# Altium footprint library Connector B2B.PcbLib: 8 footprints
Each footprint in its own frame and in the unit in brackets; x right, y up, seen from the top. Pads: shape width x height; smd on the part's side, far side on the other; paste and mask are expansions set on the pad; w line width, h text height; cw(c..) or ccw(c..) is an arc to the next point about the centre after c.
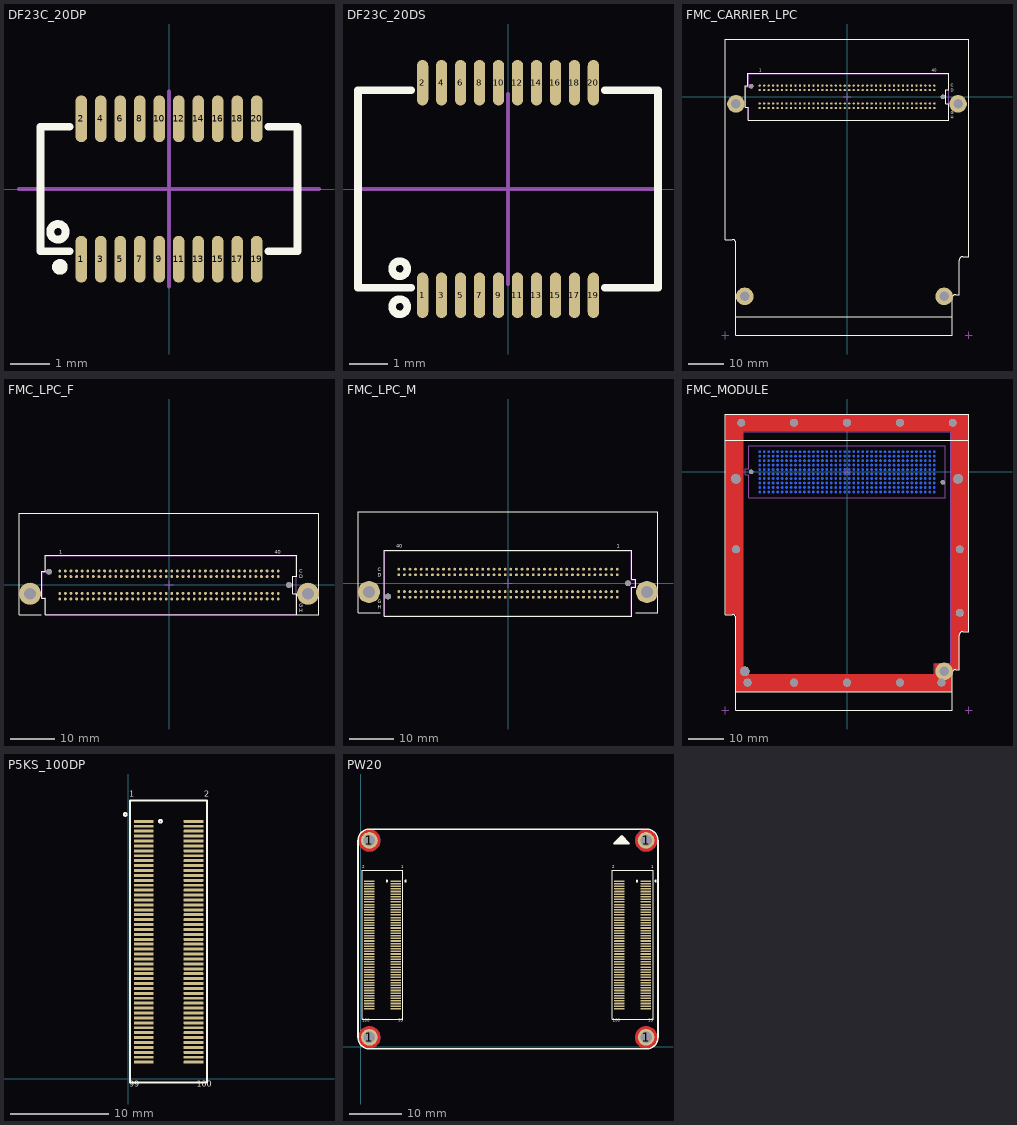
[diagram p0: the footprints below, top view; thin cyan lines are the x and y axes]

## DF23C_20DP [mm] "Hirose Connector DF23C-20DP-0.5V(92) 20WAY pitch:0.5mm"
height 1.5
pads (20):
  oval 0.3x1.2 smd mask+0.075: 1(-2.25,-1.8) 2(-2.25,1.8) 3(-1.75,-1.8) 4(-1.75,1.8) 5(-1.25,-1.8) 6(-1.25,1.8) 7(-0.75,-1.8) 8(-0.75,1.8) 9(-0.25,-1.8) 10(-0.25,1.8) 11(0.25,-1.8) 12(0.25,1.8) 13(0.75,-1.8) 14(0.75,1.8) 15(1.25,-1.8) 16(1.25,1.8) 17(1.75,-1.8) 18(1.75,1.8) 19(2.25,-1.8) 20(2.25,1.8)
Top Overlay:
  circle w0.2: c-2.8,-2 r0.1
  circle w0.2: c-2.85,-1.1 r0.2
  lines w0.2: -2.55,-1.6 -3.3,-1.6 -3.3,1.6 -2.55,1.6 ; 2.55,-1.6 3.3,-1.6 3.3,1.6 2.55,1.6
Mechanical 13:
  lines w0.1: -3.85,0 3.85,0 ; 0,-2.5 0,2.5
3D body "DF23C-20DP-0.5V.stp": height 1.2, standoff 0, extent -3.25,-2.15 3.25,2.15

## DF23C_20DS [mm] "Hirose Connector DF23C-20DS-0.5V(51) 20WAY pitch:0.5mm"
height 1.5
pads (20):
  oval 0.3x1.2 smd mask+0.075: 1(-2.25,-2.8) 2(-2.25,2.8) 3(-1.75,-2.8) 4(-1.75,2.8) 5(-1.25,-2.8) 6(-1.25,2.8) 7(-0.75,-2.8) 8(-0.75,2.8) 9(-0.25,-2.8) 10(-0.25,2.8) 11(0.25,-2.8) 12(0.25,2.8) 13(0.75,-2.8) 14(0.75,2.8) 15(1.25,-2.8) 16(1.25,2.8) 17(1.75,-2.8) 18(1.75,2.8) 19(2.25,-2.8) 20(2.25,2.8)
Top Overlay:
  circle w0.2: c-2.85,-2.1 r0.2
  circle w0.2: c-2.85,-3.1 r0.2
  lines w0.2: -2.55,-2.6 -3.95,-2.6 -3.95,2.6 -2.55,2.6 ; 2.55,-2.6 3.95,-2.6 3.95,2.6 2.55,2.6
Mechanical 13:
  lines w0.1: -3.85,0 3.85,0 ; 0,-2.5 0,2.5
3D body "DF23C-20DS-0.5V.stp": height 1.42, standoff -0.03, extent -3.8,-3 3.8,3

## FMC_CARRIER_LPC [mm] "ASP-134603"
height 1.2
pads (166):
  round 0.65 smd: C1(-24.765,3.175) C2(-23.495,3.175) C3(-22.225,3.175) C4(-20.955,3.175) C5(-19.685,3.175) C6(-18.415,3.175) C7(-17.145,3.175) C8(-15.875,3.175) C9(-14.605,3.175) C10(-13.335,3.175) C11(-12.065,3.175) C12(-10.795,3.175) C13(-9.525,3.175) C14(-8.255,3.175) C15(-6.985,3.175) C16(-5.715,3.175) C17(-4.445,3.175) C18(-3.175,3.175) C19(-1.905,3.175) C20(-0.635,3.175) C21(0.635,3.175) C22(1.905,3.175) C23(3.175,3.175) C24(4.445,3.175) C25(5.715,3.175) C26(6.985,3.175) C27(8.255,3.175) C28(9.525,3.175) C29(10.795,3.175) C30(12.065,3.175) C31(13.335,3.175) C32(14.605,3.175) C33(15.875,3.175) C34(17.145,3.175) C35(18.415,3.175) C36(19.685,3.175) C37(20.955,3.175) C38(22.225,3.175) C39(23.495,3.175) C40(24.765,3.175) D1(-24.765,1.905) D2(-23.495,1.905) D3(-22.225,1.905) D4(-20.955,1.905) D5(-19.685,1.905) D6(-18.415,1.905) D7(-17.145,1.905) D8(-15.875,1.905) D9(-14.605,1.905) D10(-13.335,1.905) D11(-12.065,1.905) D12(-10.795,1.905) D13(-9.525,1.905) D14(-8.255,1.905) D15(-6.985,1.905) D16(-5.715,1.905) D17(-4.445,1.905) D18(-3.175,1.905) D19(-1.905,1.905) D20(-0.635,1.905) D21(0.635,1.905) D22(1.905,1.905) D23(3.175,1.905) D24(4.445,1.905) D25(5.715,1.905) D26(6.985,1.905) D27(8.255,1.905) D28(9.525,1.905) D29(10.795,1.905) D30(12.065,1.905) D31(13.335,1.905) D32(14.605,1.905) D33(15.875,1.905) D34(17.145,1.905) D35(18.415,1.905) D36(19.685,1.905) D37(20.955,1.905) D38(22.225,1.905) D39(23.495,1.905) D40(24.765,1.905) G1(-24.765,-1.905) G2(-23.495,-1.905) G3(-22.225,-1.905) G4(-20.955,-1.905) G5(-19.685,-1.905) G6(-18.415,-1.905) G7(-17.145,-1.905) G8(-15.875,-1.905) G9(-14.605,-1.905) G10(-13.335,-1.905) G11(-12.065,-1.905) G12(-10.795,-1.905) G13(-9.525,-1.905) G14(-8.255,-1.905) G15(-6.985,-1.905) G16(-5.715,-1.905) G17(-4.445,-1.905) G18(-3.175,-1.905) G19(-1.905,-1.905) G20(-0.635,-1.905) G21(0.635,-1.905) G22(1.905,-1.905) G23(3.175,-1.905) G24(4.445,-1.905) G25(5.715,-1.905) G26(6.985,-1.905) G27(8.255,-1.905) G28(9.525,-1.905) G29(10.795,-1.905) G30(12.065,-1.905) G31(13.335,-1.905) G32(14.605,-1.905) G33(15.875,-1.905) G34(17.145,-1.905) G35(18.415,-1.905) G36(19.685,-1.905) G37(20.955,-1.905) G38(22.225,-1.905) G39(23.495,-1.905) G40(24.765,-1.905) H1(-24.765,-3.175) H2(-23.495,-3.175) H3(-22.225,-3.175) H4(-20.955,-3.175) H5(-19.685,-3.175) H6(-18.415,-3.175) H7(-17.145,-3.175) H8(-15.875,-3.175) H9(-14.605,-3.175) H10(-13.335,-3.175) H11(-12.065,-3.175) H12(-10.795,-3.175) H13(-9.525,-3.175) H14(-8.255,-3.175) H15(-6.985,-3.175) H16(-5.715,-3.175) H17(-4.445,-3.175) H18(-3.175,-3.175) H19(-1.905,-3.175) H20(-0.635,-3.175) H21(0.635,-3.175) H22(1.905,-3.175) H23(3.175,-3.175) H24(4.445,-3.175) H25(5.715,-3.175) H26(6.985,-3.175) H27(8.255,-3.175) H28(9.525,-3.175) H29(10.795,-3.175) H30(12.065,-3.175) H31(13.335,-3.175) H32(14.605,-3.175) H33(15.875,-3.175) H34(17.145,-3.175) H35(18.415,-3.175) H36(19.685,-3.175) H37(20.955,-3.175) H38(22.225,-3.175) H39(23.495,-3.175) H40(24.765,-3.175)
  round 5 hole 2.7: ""(-31.5,-2) ""(-29,-56.6) ""(27.55,-56.6) ""(31.5,-2)
  round 1.3 hole 1.3 unplated: ""(-27.2,3) ""(27.2,0)
Top Overlay:
  lines w0.2: -31.5,-62.4 29.8,-62.4 ; -34.5,-40.5 -32.5,-40.5 cw(c-32.5,-41.5) -31.5,-41.5 -31.5,-67.7 29.8,-67.7 29.8,-57.1 cw(c30.8,-57.1) 30.8,-56.1 31.9,-56.1 31.9,-46.3 cw(c32.9,-46.3) 32.9,-45.3 34.5,-45.3 34.5,8.9 34.5,16.4 -34.5,16.4 -34.5,8.9 -34.5,-40.5 ; -28.8,-3 -28,-3 -28,-6.7 28.9,-6.7 28.9,-2 28,-2 28,2 28.9,2 28.9,6.7 -28.1,6.7 -28.1,3.1 -28.8,3.1 -28.8,-3
  text "C" at 29.5,2.8 h0.8
  text "D" at 29.5,1.5 h0.8
  text "G" at 29.5,-5 h0.8
  text "H" at 29.5,-6.2 h0.8
  text "40" at 24,7.1 h0.8
  text "1" at -24.9,7.1 h0.8
Mechanical 1:
  lines w0.2: -35.5,-67.7 -33.5,-67.7 ; -34.5,-68.7 -34.5,-66.7 ; -1,0 1,0 ; 0,-1 0,1 ; 33.5,-67.7 35.5,-67.7 ; 34.5,-68.7 34.5,-66.7
Mechanical 13:
  lines w0.2: -28.7,-2.9 -28.7,2.9 -27.9,2.9 -27.9,6.6 28.8,6.6 28.8,-6.6 -27.9,-6.6 -27.9,-2.9 -28.7,-2.9
3D body "SEAF-40-05.0-L-10-1-A-K-TR.stp": height 5.12, standoff -1.21, extent -28.727,-6.642 28.727,6.642

## FMC_LPC_F [mm] "Samtec FMC (FPGA mezzanine Card) LPC female, ASP-134603"
height 6.5
pads (164):
  round 0.65 smd: C1(-24.765,3.175) C2(-23.495,3.175) C3(-22.225,3.175) C4(-20.955,3.175) C5(-19.685,3.175) C6(-18.415,3.175) C7(-17.145,3.175) C8(-15.875,3.175) C9(-14.605,3.175) C10(-13.335,3.175) C11(-12.065,3.175) C12(-10.795,3.175) C13(-9.525,3.175) C14(-8.255,3.175) C15(-6.985,3.175) C16(-5.715,3.175) C17(-4.445,3.175) C18(-3.175,3.175) C19(-1.905,3.175) C20(-0.635,3.175) C21(0.635,3.175) C22(1.905,3.175) C23(3.175,3.175) C24(4.445,3.175) C25(5.715,3.175) C26(6.985,3.175) C27(8.255,3.175) C28(9.525,3.175) C29(10.795,3.175) C30(12.065,3.175) C31(13.335,3.175) C32(14.605,3.175) C33(15.875,3.175) C34(17.145,3.175) C35(18.415,3.175) C36(19.685,3.175) C37(20.955,3.175) C38(22.225,3.175) C39(23.495,3.175) C40(24.765,3.175) D1(-24.765,1.905) D2(-23.495,1.905) D3(-22.225,1.905) D4(-20.955,1.905) D5(-19.685,1.905) D6(-18.415,1.905) D7(-17.145,1.905) D8(-15.875,1.905) D9(-14.605,1.905) D10(-13.335,1.905) D11(-12.065,1.905) D12(-10.795,1.905) D13(-9.525,1.905) D14(-8.255,1.905) D15(-6.985,1.905) D16(-5.715,1.905) D17(-4.445,1.905) D18(-3.175,1.905) D19(-1.905,1.905) D20(-0.635,1.905) D21(0.635,1.905) D22(1.905,1.905) D23(3.175,1.905) D24(4.445,1.905) D25(5.715,1.905) D26(6.985,1.905) D27(8.255,1.905) D28(9.525,1.905) D29(10.795,1.905) D30(12.065,1.905) D31(13.335,1.905) D32(14.605,1.905) D33(15.875,1.905) D34(17.145,1.905) D35(18.415,1.905) D36(19.685,1.905) D37(20.955,1.905) D38(22.225,1.905) D39(23.495,1.905) D40(24.765,1.905) G1(-24.765,-1.905) G2(-23.495,-1.905) G3(-22.225,-1.905) G4(-20.955,-1.905) G5(-19.685,-1.905) G6(-18.415,-1.905) G7(-17.145,-1.905) G8(-15.875,-1.905) G9(-14.605,-1.905) G10(-13.335,-1.905) G11(-12.065,-1.905) G12(-10.795,-1.905) G13(-9.525,-1.905) G14(-8.255,-1.905) G15(-6.985,-1.905) G16(-5.715,-1.905) G17(-4.445,-1.905) G18(-3.175,-1.905) G19(-1.905,-1.905) G20(-0.635,-1.905) G21(0.635,-1.905) G22(1.905,-1.905) G23(3.175,-1.905) G24(4.445,-1.905) G25(5.715,-1.905) G26(6.985,-1.905) G27(8.255,-1.905) G28(9.525,-1.905) G29(10.795,-1.905) G30(12.065,-1.905) G31(13.335,-1.905) G32(14.605,-1.905) G33(15.875,-1.905) G34(17.145,-1.905) G35(18.415,-1.905) G36(19.685,-1.905) G37(20.955,-1.905) G38(22.225,-1.905) G39(23.495,-1.905) G40(24.765,-1.905) H1(-24.765,-3.175) H2(-23.495,-3.175) H3(-22.225,-3.175) H4(-20.955,-3.175) H5(-19.685,-3.175) H6(-18.415,-3.175) H7(-17.145,-3.175) H8(-15.875,-3.175) H9(-14.605,-3.175) H10(-13.335,-3.175) H11(-12.065,-3.175) H12(-10.795,-3.175) H13(-9.525,-3.175) H14(-8.255,-3.175) H15(-6.985,-3.175) H16(-5.715,-3.175) H17(-4.445,-3.175) H18(-3.175,-3.175) H19(-1.905,-3.175) H20(-0.635,-3.175) H21(0.635,-3.175) H22(1.905,-3.175) H23(3.175,-3.175) H24(4.445,-3.175) H25(5.715,-3.175) H26(6.985,-3.175) H27(8.255,-3.175) H28(9.525,-3.175) H29(10.795,-3.175) H30(12.065,-3.175) H31(13.335,-3.175) H32(14.605,-3.175) H33(15.875,-3.175) H34(17.145,-3.175) H35(18.415,-3.175) H36(19.685,-3.175) H37(20.955,-3.175) H38(22.225,-3.175) H39(23.495,-3.175) H40(24.765,-3.175)
  round 5 hole 2.7: ""(-31.5,-2) ""(31.5,-2)
  round 1.3 hole 1.3 unplated: ""(-27.2,3) ""(27.2,0)
Top Overlay:
  lines w0.2: -29,-6.7 -34,-6.7 -34,16.2 34,16.2 34,-6.7 29,-6.7 ; -28.8,-3 -28.8,3.1 -28.1,3.1 -28.1,6.7 28.9,6.7 28.9,2 28,2 28,-2 28.9,-2 28.9,-6.7 -28,-6.7 -28,-3 -28.8,-3
  text "1" at -24.9,7.1 h0.8
  text "40" at 24,7.1 h0.8
  text "H" at 29.5,-6.2 h0.8
  text "G" at 29.5,-5 h0.8
  text "D" at 29.5,1.5 h0.8
  text "C" at 29.5,2.8 h0.8
Mechanical 1:
  lines w0.2: -1,0 1,0 ; 0,-1 0,1
Mechanical 13:
  lines w0.2: -28.7,-2.9 -27.9,-2.9 -27.9,-6.6 28.8,-6.6 28.8,6.6 -27.9,6.6 -27.9,2.9 -28.7,2.9 -28.7,-2.9
3D body "SEAF-40-05.0-L-10-1-A-K-TR.stp": height 5.12, standoff -1.21, extent -28.727,-6.642 28.727,6.642

## FMC_LPC_M [mm] "Samtec FMC (FPGA mezzanine Card) LPC male, ASP-134604"
height 6.5
pads (164):
  round 0.65 smd: C1(24.765,3.175) C2(23.495,3.175) C3(22.225,3.175) C4(20.955,3.175) C5(19.685,3.175) C6(18.415,3.175) C7(17.145,3.175) C8(15.875,3.175) C9(14.605,3.175) C10(13.335,3.175) C11(12.065,3.175) C12(10.795,3.175) C13(9.525,3.175) C14(8.255,3.175) C15(6.985,3.175) C16(5.715,3.175) C17(4.445,3.175) C18(3.175,3.175) C19(1.905,3.175) C20(0.635,3.175) C21(-0.635,3.175) C22(-1.905,3.175) C23(-3.175,3.175) C24(-4.445,3.175) C25(-5.715,3.175) C26(-6.985,3.175) C27(-8.255,3.175) C28(-9.525,3.175) C29(-10.795,3.175) C30(-12.065,3.175) C31(-13.335,3.175) C32(-14.605,3.175) C33(-15.875,3.175) C34(-17.145,3.175) C35(-18.415,3.175) C36(-19.685,3.175) C37(-20.955,3.175) C38(-22.225,3.175) C39(-23.495,3.175) C40(-24.765,3.175) D1(24.765,1.905) D2(23.495,1.905) D3(22.225,1.905) D4(20.955,1.905) D5(19.685,1.905) D6(18.415,1.905) D7(17.145,1.905) D8(15.875,1.905) D9(14.605,1.905) D10(13.335,1.905) D11(12.065,1.905) D12(10.795,1.905) D13(9.525,1.905) D14(8.255,1.905) D15(6.985,1.905) D16(5.715,1.905) D17(4.445,1.905) D18(3.175,1.905) D19(1.905,1.905) D20(0.635,1.905) D21(-0.635,1.905) D22(-1.905,1.905) D23(-3.175,1.905) D24(-4.445,1.905) D25(-5.715,1.905) D26(-6.985,1.905) D27(-8.255,1.905) D28(-9.525,1.905) D29(-10.795,1.905) D30(-12.065,1.905) D31(-13.335,1.905) D32(-14.605,1.905) D33(-15.875,1.905) D34(-17.145,1.905) D35(-18.415,1.905) D36(-19.685,1.905) D37(-20.955,1.905) D38(-22.225,1.905) D39(-23.495,1.905) D40(-24.765,1.905) G1(24.765,-1.905) G2(23.495,-1.905) G3(22.225,-1.905) G4(20.955,-1.905) G5(19.685,-1.905) G6(18.415,-1.905) G7(17.145,-1.905) G8(15.875,-1.905) G9(14.605,-1.905) G10(13.335,-1.905) G11(12.065,-1.905) G12(10.795,-1.905) G13(9.525,-1.905) G14(8.255,-1.905) G15(6.985,-1.905) G16(5.715,-1.905) G17(4.445,-1.905) G18(3.175,-1.905) G19(1.905,-1.905) G20(0.635,-1.905) G21(-0.635,-1.905) G22(-1.905,-1.905) G23(-3.175,-1.905) G24(-4.445,-1.905) G25(-5.715,-1.905) G26(-6.985,-1.905) G27(-8.255,-1.905) G28(-9.525,-1.905) G29(-10.795,-1.905) G30(-12.065,-1.905) G31(-13.335,-1.905) G32(-14.605,-1.905) G33(-15.875,-1.905) G34(-17.145,-1.905) G35(-18.415,-1.905) G36(-19.685,-1.905) G37(-20.955,-1.905) G38(-22.225,-1.905) G39(-23.495,-1.905) G40(-24.765,-1.905) H1(24.765,-3.175) H2(23.495,-3.175) H3(22.225,-3.175) H4(20.955,-3.175) H5(19.685,-3.175) H6(18.415,-3.175) H7(17.145,-3.175) H8(15.875,-3.175) H9(14.605,-3.175) H10(13.335,-3.175) H11(12.065,-3.175) H12(10.795,-3.175) H13(9.525,-3.175) H14(8.255,-3.175) H15(6.985,-3.175) H16(5.715,-3.175) H17(4.445,-3.175) H18(3.175,-3.175) H19(1.905,-3.175) H20(0.635,-3.175) H21(-0.635,-3.175) H22(-1.905,-3.175) H23(-3.175,-3.175) H24(-4.445,-3.175) H25(-5.715,-3.175) H26(-6.985,-3.175) H27(-8.255,-3.175) H28(-9.525,-3.175) H29(-10.795,-3.175) H30(-12.065,-3.175) H31(-13.335,-3.175) H32(-14.605,-3.175) H33(-15.875,-3.175) H34(-17.145,-3.175) H35(-18.415,-3.175) H36(-19.685,-3.175) H37(-20.955,-3.175) H38(-22.225,-3.175) H39(-23.495,-3.175) H40(-24.765,-3.175)
  round 5 hole 2.7: ""(-31.5,-2) ""(31.5,-2)
  round 1.3 hole 1.3 unplated: ""(-27.2,-3) ""(27.2,0)
Top Overlay:
  lines w0.2: -29,-6.7 -34,-6.7 -34,16.2 34,16.2 34,-6.7 29,-6.7 ; -28,-7.5 28,-7.5 28,-0.9 28.9,-0.9 28.9,0.9 28,0.9 28,7.5 -28,7.5 -28,-7.5
  text "H" at -29.5,-5.8 h0.8
  text "G" at -29.5,-4.5 h0.8
  text "D" at -29.5,1.5 h0.8
  text "C" at -29.5,2.7 h0.8
  text "40" at -25.3,8 h0.8
  text "1" at 24.6,8 h0.8
Mechanical 1:
  lines w0.2: -1,0 1,0 ; 0,-1 0,1
Mechanical 13:
  lines w0.2: -27.9,-7.4 -27.9,7.4 27.9,7.4 27.9,0.8 28.8,0.8 28.8,-0.8 27.9,-0.8 27.9,-7.4 -27.9,-7.4
3D body "SEAM-40-02.0-L-10-1-A-K-TR.stp": height 5.66, standoff -1.22, extent -27.889,-7.34 28.778,7.341

## FMC_MODULE [mm] "ASP-134488"
height 1.2
pads (419):
  round 0.65 smd far side: A1(-24.765,5.715) A2(-23.495,5.715) A3(-22.225,5.715) A4(-20.955,5.715) A5(-19.685,5.715) A6(-18.415,5.715) A7(-17.145,5.715) A8(-15.875,5.715) A9(-14.605,5.715) A10(-13.335,5.715) A11(-12.065,5.715) A12(-10.795,5.715) A13(-9.525,5.715) A14(-8.255,5.715) A15(-6.985,5.715) A16(-5.715,5.715) A17(-4.445,5.715) A18(-3.175,5.715) A19(-1.905,5.715) A20(-0.635,5.715) A21(0.635,5.715) A22(1.905,5.715) A23(3.175,5.715) A24(4.445,5.715) A25(5.715,5.715) A26(6.985,5.715) A27(8.255,5.715) A28(9.525,5.715) A29(10.795,5.715) A30(12.065,5.715) A31(13.335,5.715) A32(14.605,5.715) A33(15.875,5.715) A34(17.145,5.715) A35(18.415,5.715) A36(19.685,5.715) A37(20.955,5.715) A38(22.225,5.715) A39(23.495,5.715) A40(24.765,5.715) B1(-24.765,4.445) B2(-23.495,4.445) B3(-22.225,4.445) B4(-20.955,4.445) B5(-19.685,4.445) B6(-18.415,4.445) B7(-17.145,4.445) B8(-15.875,4.445) B9(-14.605,4.445) B10(-13.335,4.445) B11(-12.065,4.445) B12(-10.795,4.445) B13(-9.525,4.445) B14(-8.255,4.445) B15(-6.985,4.445) B16(-5.715,4.445) B17(-4.445,4.445) B18(-3.175,4.445) B19(-1.905,4.445) B20(-0.635,4.445) B21(0.635,4.445) B22(1.905,4.445) B23(3.175,4.445) B24(4.445,4.445) B25(5.715,4.445) B26(6.985,4.445) B27(8.255,4.445) B28(9.525,4.445) B29(10.795,4.445) B30(12.065,4.445) B31(13.335,4.445) B32(14.605,4.445) B33(15.875,4.445) B34(17.145,4.445) B35(18.415,4.445) B36(19.685,4.445) B37(20.955,4.445) B38(22.225,4.445) B39(23.495,4.445) B40(24.765,4.445) C1(-24.765,3.175) C2(-23.495,3.175) C3(-22.225,3.175) C4(-20.955,3.175) C5(-19.685,3.175) C6(-18.415,3.175) C7(-17.145,3.175) C8(-15.875,3.175) C9(-14.605,3.175) C10(-13.335,3.175) C11(-12.065,3.175) C12(-10.795,3.175) C13(-9.525,3.175) C14(-8.255,3.175) C15(-6.985,3.175) C16(-5.715,3.175) C17(-4.445,3.175) C18(-3.175,3.175) C19(-1.905,3.175) C20(-0.635,3.175) C21(0.635,3.175) C22(1.905,3.175) C23(3.175,3.175) C24(4.445,3.175) C25(5.715,3.175) C26(6.985,3.175) C27(8.255,3.175) C28(9.525,3.175) C29(10.795,3.175) C30(12.065,3.175) C31(13.335,3.175) C32(14.605,3.175) C33(15.875,3.175) C34(17.145,3.175) C35(18.415,3.175) C36(19.685,3.175) C37(20.955,3.175) C38(22.225,3.175) C39(23.495,3.175) C40(24.765,3.175) D1(-24.765,1.905) D2(-23.495,1.905) D3(-22.225,1.905) D4(-20.955,1.905) D5(-19.685,1.905) D6(-18.415,1.905) D7(-17.145,1.905) D8(-15.875,1.905) D9(-14.605,1.905) D10(-13.335,1.905) D11(-12.065,1.905) D12(-10.795,1.905) D13(-9.525,1.905) D14(-8.255,1.905) D15(-6.985,1.905) D16(-5.715,1.905) D17(-4.445,1.905) D18(-3.175,1.905) D19(-1.905,1.905) D20(-0.635,1.905) D21(0.635,1.905) D22(1.905,1.905) D23(3.175,1.905) D24(4.445,1.905) D25(5.715,1.905) D26(6.985,1.905) D27(8.255,1.905) D28(9.525,1.905) D29(10.795,1.905) D30(12.065,1.905) D31(13.335,1.905) D32(14.605,1.905) D33(15.875,1.905) D34(17.145,1.905) D35(18.415,1.905) D36(19.685,1.905) D37(20.955,1.905) D38(22.225,1.905) D39(23.495,1.905) D40(24.765,1.905) E1(-24.765,0.635) E2(-23.495,0.635) E3(-22.225,0.635) E4(-20.955,0.635) E5(-19.685,0.635) E6(-18.415,0.635) E7(-17.145,0.635) E8(-15.875,0.635) E9(-14.605,0.635) E10(-13.335,0.635) E11(-12.065,0.635) E12(-10.795,0.635) E13(-9.525,0.635) E14(-8.255,0.635) E15(-6.985,0.635) E16(-5.715,0.635) E17(-4.445,0.635) E18(-3.175,0.635) E19(-1.905,0.635) E20(-0.635,0.635) E21(0.635,0.635) E22(1.905,0.635) E23(3.175,0.635) E24(4.445,0.635) E25(5.715,0.635) E26(6.985,0.635) E27(8.255,0.635) E28(9.525,0.635) E29(10.795,0.635) E30(12.065,0.635) E31(13.335,0.635) E32(14.605,0.635) E33(15.875,0.635) E34(17.145,0.635) E35(18.415,0.635) E36(19.685,0.635) E37(20.955,0.635) E38(22.225,0.635) E39(23.495,0.635) E40(24.765,0.635) F1(-24.765,-0.635) F2(-23.495,-0.635) F3(-22.225,-0.635) F4(-20.955,-0.635) F5(-19.685,-0.635) F6(-18.415,-0.635) F7(-17.145,-0.635) F8(-15.875,-0.635) F9(-14.605,-0.635) F10(-13.335,-0.635) F11(-12.065,-0.635) F12(-10.795,-0.635) F13(-9.525,-0.635) F14(-8.255,-0.635) F15(-6.985,-0.635) F16(-5.715,-0.635) F17(-4.445,-0.635) F18(-3.175,-0.635) F19(-1.905,-0.635) F20(-0.635,-0.635) F21(0.635,-0.635) F22(1.905,-0.635) F23(3.175,-0.635) F24(4.445,-0.635) F25(5.715,-0.635) F26(6.985,-0.635) F27(8.255,-0.635) F28(9.525,-0.635) F29(10.795,-0.635) F30(12.065,-0.635) F31(13.335,-0.635) F32(14.605,-0.635) F33(15.875,-0.635) F34(17.145,-0.635) F35(18.415,-0.635) F36(19.685,-0.635) F37(20.955,-0.635) F38(22.225,-0.635) F39(23.495,-0.635) F40(24.765,-0.635) G1(-24.765,-1.905) G2(-23.495,-1.905) G3(-22.225,-1.905) G4(-20.955,-1.905) G5(-19.685,-1.905) G6(-18.415,-1.905) G7(-17.145,-1.905) G8(-15.875,-1.905) G9(-14.605,-1.905) G10(-13.335,-1.905) G11(-12.065,-1.905) G12(-10.795,-1.905) G13(-9.525,-1.905) G14(-8.255,-1.905) G15(-6.985,-1.905) G16(-5.715,-1.905) G17(-4.445,-1.905) G18(-3.175,-1.905) G19(-1.905,-1.905) G20(-0.635,-1.905) G21(0.635,-1.905) G22(1.905,-1.905) G23(3.175,-1.905) G24(4.445,-1.905) G25(5.715,-1.905) G26(6.985,-1.905) G27(8.255,-1.905) G28(9.525,-1.905) G29(10.795,-1.905) G30(12.065,-1.905) G31(13.335,-1.905) G32(14.605,-1.905) G33(15.875,-1.905) G34(17.145,-1.905) G35(18.415,-1.905) G36(19.685,-1.905) G37(20.955,-1.905) G38(22.225,-1.905) G39(23.495,-1.905) G40(24.765,-1.905) H1(-24.765,-3.175) H2(-23.495,-3.175) H3(-22.225,-3.175) H4(-20.955,-3.175) H5(-19.685,-3.175) H6(-18.415,-3.175) H7(-17.145,-3.175) H8(-15.875,-3.175) H9(-14.605,-3.175) H10(-13.335,-3.175) H11(-12.065,-3.175) H12(-10.795,-3.175) H13(-9.525,-3.175) H14(-8.255,-3.175) H15(-6.985,-3.175) H16(-5.715,-3.175) H17(-4.445,-3.175) H18(-3.175,-3.175) H19(-1.905,-3.175) H20(-0.635,-3.175) H21(0.635,-3.175) H22(1.905,-3.175) H23(3.175,-3.175) H24(4.445,-3.175) H25(5.715,-3.175) H26(6.985,-3.175) H27(8.255,-3.175) H28(9.525,-3.175) H29(10.795,-3.175) H30(12.065,-3.175) H31(13.335,-3.175) H32(14.605,-3.175) H33(15.875,-3.175) H34(17.145,-3.175) H35(18.415,-3.175) H36(19.685,-3.175) H37(20.955,-3.175) H38(22.225,-3.175) H39(23.495,-3.175) H40(24.765,-3.175) J1(-24.765,-4.445) J2(-23.495,-4.445) J3(-22.225,-4.445) J4(-20.955,-4.445) J5(-19.685,-4.445) J6(-18.415,-4.445) J7(-17.145,-4.445) J8(-15.875,-4.445) J9(-14.605,-4.445) J10(-13.335,-4.445) J11(-12.065,-4.445) J12(-10.795,-4.445) J13(-9.525,-4.445) J14(-8.255,-4.445) J15(-6.985,-4.445) J16(-5.715,-4.445) J17(-4.445,-4.445) J18(-3.175,-4.445) J19(-1.905,-4.445) J20(-0.635,-4.445) J21(0.635,-4.445) J22(1.905,-4.445) J23(3.175,-4.445) J24(4.445,-4.445) J25(5.715,-4.445) J26(6.985,-4.445) J27(8.255,-4.445) J28(9.525,-4.445) J29(10.795,-4.445) J30(12.065,-4.445) J31(13.335,-4.445) J32(14.605,-4.445) J33(15.875,-4.445) J34(17.145,-4.445) J35(18.415,-4.445) J36(19.685,-4.445) J37(20.955,-4.445) J38(22.225,-4.445) J39(23.495,-4.445) J40(24.765,-4.445) K1(-24.765,-5.715) K2(-23.495,-5.715) K3(-22.225,-5.715) K4(-20.955,-5.715) K5(-19.685,-5.715) K6(-18.415,-5.715) K7(-17.145,-5.715) K8(-15.875,-5.715) K9(-14.605,-5.715) K10(-13.335,-5.715) K11(-12.065,-5.715) K12(-10.795,-5.715) K13(-9.525,-5.715) K14(-8.255,-5.715) K15(-6.985,-5.715) K16(-5.715,-5.715) K17(-4.445,-5.715) K18(-3.175,-5.715) K19(-1.905,-5.715) K20(-0.635,-5.715) K21(0.635,-5.715) K22(1.905,-5.715) K23(3.175,-5.715) K24(4.445,-5.715) K25(5.715,-5.715) K26(6.985,-5.715) K27(8.255,-5.715) K28(9.525,-5.715) K29(10.795,-5.715) K30(12.065,-5.715) K31(13.335,-5.715) K32(14.605,-5.715) K33(15.875,-5.715) K34(17.145,-5.715) K35(18.415,-5.715) K36(19.685,-5.715) K37(20.955,-5.715) K38(22.225,-5.715) K39(23.495,-5.715) K40(24.765,-5.715)
  round 2.2 hole 2.2: ""(-31.5,-22) ""(-30,13.9) ""(-28.2,-59.8) ""(-15,-59.8) ""(-15,13.9) ""(0,-59.8) ""(0,13.9) ""(15,-59.8) ""(15,13.9) ""(26.8,-59.8) ""(30,13.9) ""(32,-40) ""(32,-22)
  round 2.7 hole 2.7: ""(-31.5,-2) ""(-29,-56.6) ""(31.5,-2)
  round 1.3 hole 1.3 unplated: ""(-27.2,0) ""(27.2,-3)
  round 5 hole 2.7: ""(27.55,-56.6)
Top Layer:
  rectangle: -34.5,11.4 34.5,16.4
  rectangle: -34.5,-40.5 -29.5,16.4
  rectangle: -31.5,-62.4 -29.5,-40.5
  rectangle: -31.5,-62.4 29.8,-57.4
  rectangle: 24.8,-62.4 29.8,-54.4
  rectangle: 29.5,-56.1 31.9,-45.3
  rectangle: 29.5,-45.3 34.5,16.4
Top Overlay:
  lines w0.2: -31.5,-62.4 29.8,-62.4 ; -34.5,8.9 -34.5,-40.5 -32.5,-40.5 cw(c-32.5,-41.5) -31.5,-41.5 -31.5,-67.7 29.8,-67.7 29.8,-57.1 cw(c30.8,-57.1) 30.8,-56.1 31.9,-56.1 31.9,-46.3 cw(c32.9,-46.3) 32.9,-45.3 34.5,-45.3 34.5,8.9 ; -34.5,8.9 34.5,8.9 ; -34.5,8.9 -34.5,16.4 34.5,16.4 34.5,8.9
Bottom Overlay:
  lines w0.2: -29,-6.7 -34,-6.7 -34,16.2 34,16.2 34,-6.7 29,-6.7 ; -28.9,-0.9 -28.9,0.9 -28,0.9 -28,7.5 28,7.5 28,-7.5 -28,-7.5 -28,-0.9 -28.9,-0.9
  text "K" at 29.3,-6.2 h0.8
  text "J" at 29.3,-5 h0.8
  text "E" at 29.3,0.2 h0.8
  text "D" at 29.3,1.5 h0.8
  text "C" at 29.3,2.7 h0.8
  text "B" at 29.3,3.9 h0.8
  text "A" at 29.3,5.2 h0.8
  text "40" at 25.3,8 h0.8
  text "1" at -24.6,8 h0.8
Mechanical 1:
  lines w0.2: -35.5,-67.7 -33.5,-67.7 ; -34.5,-68.7 -34.5,-66.7 ; -1,0 1,0 ; 0,-1 0,1 ; 24.8,-57.4 -29.5,-57.4 -29.5,11.4 29.5,11.4 29.5,-54.4 24.8,-54.4 24.8,-57.3 ; 33.5,-67.7 35.5,-67.7 ; 34.5,-68.7 34.5,-66.7
Mechanical 13:
  lines w0.2: -28.8,-0.8 -27.9,-0.8 -27.9,-7.4 27.9,-7.4 27.9,7.4 -27.9,7.4 -27.9,0.8 -28.8,0.8 -28.8,-0.8
3D body "SEAM-40-02.0-L-10-1-A-K-TR.stp": height 5.66, standoff -1.22, extent -28.778,-7.341 27.889,7.341

## P5KS_100DP [mm] "Panasonic Connector AXK600347YG 100WAY Pitch:0.5mm"
height 1.5
pads (100):
  rrect20% 2x0.3 smd mask+0.075: 1(1.57,26.2) 2(6.64,26.2) 3(1.57,25.7) 4(6.64,25.7) 5(1.57,25.2) 6(6.64,25.2) 7(1.57,24.7) 8(6.64,24.7) 9(1.57,24.2) 10(6.64,24.2) 11(1.57,23.7) 12(6.64,23.7) 13(1.57,23.2) 14(6.64,23.2) 15(1.57,22.7) 16(6.64,22.7) 17(1.57,22.2) 18(6.64,22.2) 19(1.57,21.7) 20(6.64,21.7) 21(1.57,21.2) 22(6.64,21.2) 23(1.57,20.7) 24(6.64,20.7) 25(1.57,20.2) 26(6.64,20.2) 27(1.57,19.7) 28(6.64,19.7) 29(1.57,19.2) 30(6.64,19.2) 31(1.57,18.7) 32(6.64,18.7) 33(1.57,18.2) 34(6.64,18.2) 35(1.57,17.7) 36(6.64,17.7) 37(1.57,17.2) 38(6.64,17.2) 39(1.57,16.7) 40(6.64,16.7) 41(1.57,16.2) 42(6.64,16.2) 43(1.57,15.7) 44(6.64,15.7) 45(1.57,15.2) 46(6.64,15.2) 47(1.57,14.7) 48(6.64,14.7) 49(1.57,14.2) 50(6.64,14.2) 51(1.57,13.7) 52(6.64,13.7) 53(1.57,13.2) 54(6.64,13.2) 55(1.57,12.7) 56(6.64,12.7) 57(1.57,12.2) 58(6.64,12.2) 59(1.57,11.7) 60(6.64,11.7) 61(1.57,11.2) 62(6.64,11.2) 63(1.57,10.7) 64(6.64,10.7) 65(1.57,10.2) 66(6.64,10.2) 67(1.57,9.7) 68(6.64,9.7) 69(1.57,9.2) 70(6.64,9.2) 71(1.57,8.7) 72(6.64,8.7) 73(1.57,8.2) 74(6.64,8.2) 75(1.57,7.7) 76(6.64,7.7) 77(1.57,7.2) 78(6.64,7.2) 79(1.57,6.7) 80(6.64,6.7) 81(1.57,6.2) 82(6.64,6.2) 83(1.57,5.7) 84(6.64,5.7) 85(1.57,5.2) 86(6.64,5.2) 87(1.57,4.7) 88(6.64,4.7) 89(1.57,4.2) 90(6.64,4.2) 91(1.57,3.7) 92(6.64,3.7) 93(1.57,3.2) 94(6.64,3.2) 95(1.57,2.7) 96(6.64,2.7) 97(1.57,2.2) 98(6.64,2.2) 99(1.57,1.7) 100(6.64,1.7)
Top Overlay:
  circle w0.2: c3.27,26.21 r0.15
  circle w0.2: c-0.31,26.91 r0.15
  lines w0.2: 0.19,-0.37 8.02,-0.37 8.02,28.33 0.19,28.33 0.19,-0.37
  text "100" at 6.95,-1.03 h1
  text "99" at 0.1,-1.03 h1
  text "2" at 7.75,28.49 h1
  text "1" at 0.12,28.49 h1
3D body "AXK600347Y.stp": height 2.4, standoff 0, extent 1.9,-0.13 6.5,28.07

## PW20 [mm] "2x Panasonic Connector AXK500147YG 100WAY Pitch:0.5mm"
height 1.5
pads (204):
  round 3.2 / inner round 2.5 / far side round 3.2 hole 2.2 mask+0.1: 1(1.7,1.8) 1(1.7,39.6) 1(54.81,1.8) 1(54.81,39.6)
  rrect20% 2x0.3 smd mask+0.075: 1(6.75,31.8) 1(54.77,31.8) 2(1.68,31.8) 2(49.7,31.8) 3(6.75,31.3) 3(54.77,31.3) 4(1.68,31.3) 4(49.7,31.3) 5(6.75,30.8) 5(54.77,30.8) 6(1.68,30.8) 6(49.7,30.8) 7(6.75,30.3) 7(54.77,30.3) 8(1.68,30.3) 8(49.7,30.3) 9(6.75,29.8) 9(54.77,29.8) 10(1.68,29.8) 10(49.7,29.8) 11(6.75,29.3) 11(54.77,29.3) 12(1.68,29.3) 12(49.7,29.3) 13(6.75,28.8) 13(54.77,28.8) 14(1.68,28.8) 14(49.7,28.8) 15(6.75,28.3) 15(54.77,28.3) 16(1.68,28.3) 16(49.7,28.3) 17(6.75,27.8) 17(54.77,27.8) 18(1.68,27.8) 18(49.7,27.8) 19(6.75,27.3) 19(54.77,27.3) 20(1.68,27.3) 20(49.7,27.3) 21(6.75,26.8) 21(54.77,26.8) 22(1.68,26.8) 22(49.7,26.8) 23(6.75,26.3) 23(54.77,26.3) 24(1.68,26.3) 24(49.7,26.3) 25(6.75,25.8) 25(54.77,25.8) 26(1.68,25.8) 26(49.7,25.8) 27(6.75,25.3) 27(54.77,25.3) 28(1.68,25.3) 28(49.7,25.3) 29(6.75,24.8) 29(54.77,24.8) 30(1.68,24.8) 30(49.7,24.8) 31(6.75,24.3) 31(54.77,24.3) 32(1.68,24.3) 32(49.7,24.3) 33(6.75,23.8) 33(54.77,23.8) 34(1.68,23.8) 34(49.7,23.8) 35(6.75,23.3) 35(54.77,23.3) 36(1.68,23.3) 36(49.7,23.3) 37(6.75,22.8) 37(54.77,22.8) 38(1.68,22.8) 38(49.7,22.8) 39(6.75,22.3) 39(54.77,22.3) 40(1.68,22.3) 40(49.7,22.3) 41(6.75,21.8) 41(54.77,21.8) 42(1.68,21.8) 42(49.7,21.8) 43(6.75,21.3) 43(54.77,21.3) 44(1.68,21.3) 44(49.7,21.3) 45(6.75,20.8) 45(54.77,20.8) 46(1.68,20.8) 46(49.7,20.8) 47(6.75,20.3) 47(54.77,20.3) 48(1.68,20.3) 48(49.7,20.3) 49(6.75,19.8) 49(54.77,19.8) 50(1.68,19.8) 50(49.7,19.8) 51(6.75,19.3) 51(54.77,19.3) 52(1.68,19.3) 52(49.7,19.3) 53(6.75,18.8) 53(54.77,18.8) 54(1.68,18.8) 54(49.7,18.8) 55(6.75,18.3) 55(54.77,18.3) 56(1.68,18.3) 56(49.7,18.3) 57(6.75,17.8) 57(54.77,17.8) 58(1.68,17.8) 58(49.7,17.8) 59(6.75,17.3) 59(54.77,17.3) 60(1.68,17.3) 60(49.7,17.3) 61(6.75,16.8) 61(54.77,16.8) 62(1.68,16.8) 62(49.7,16.8) 63(6.75,16.3) 63(54.77,16.3) 64(1.68,16.3) 64(49.7,16.3) 65(6.75,15.8) 65(54.77,15.8) 66(1.68,15.8) 66(49.7,15.8) 67(6.75,15.3) 67(54.77,15.3) 68(1.68,15.3) 68(49.7,15.3) 69(6.75,14.8) 69(54.77,14.8) 70(1.68,14.8) 70(49.7,14.8) 71(6.75,14.3) 71(54.77,14.3) 72(1.68,14.3) 72(49.7,14.3) 73(6.75,13.8) 73(54.77,13.8) 74(1.68,13.8) 74(49.7,13.8) 75(6.75,13.3) 75(54.77,13.3) 76(1.68,13.3) 76(49.7,13.3) 77(6.75,12.8) 77(54.77,12.8) 78(1.68,12.8) 78(49.7,12.8) 79(6.75,12.3) 79(54.77,12.3) 80(1.68,12.3) 80(49.7,12.3) 81(6.75,11.8) 81(54.77,11.8) 82(1.68,11.8) 82(49.7,11.8) 83(6.75,11.3) 83(54.77,11.3) 84(1.68,11.3) 84(49.7,11.3) 85(6.75,10.8) 85(54.77,10.8) 86(1.68,10.8) 86(49.7,10.8) 87(6.75,10.3) 87(54.77,10.3) 88(1.68,10.3) 88(49.7,10.3) 89(6.75,9.8) 89(54.77,9.8) 90(1.68,9.8) 90(49.7,9.8) 91(6.75,9.3) 91(54.77,9.3) 92(1.68,9.3) 92(49.7,9.3) 93(6.75,8.8) 93(54.77,8.8) 94(1.68,8.8) 94(49.7,8.8) 95(6.75,8.3) 95(54.77,8.3) 96(1.68,8.3) 96(49.7,8.3) 97(6.75,7.8) 97(54.77,7.8) 98(1.68,7.8) 98(49.7,7.8) 99(6.75,7.3) 99(54.77,7.3) 100(1.68,7.3) 100(49.7,7.3)
Top Layer:
  pour cut-out: 1.7,3.9 1.493,3.9 1.087,3.819 0.705,3.661 0.361,3.431 0.069,3.139 -0.161,2.795 -0.319,2.413 -0.4,2.007 -0.4,1.8 -0.4,1.593 -0.319,1.187 -0.161,0.805 0.069,0.461 0.361,0.169 0.705,-0.061 1.087,-0.219 1.493,-0.3 1.7,-0.3 1.907,-0.3 2.313,-0.219 2.695,-0.061 3.039,0.169 3.331,0.461 3.561,0.805 3.719,1.187 3.8,1.593 3.8,1.8 3.8,2.007 3.719,2.413 3.561,2.795 3.331,3.139 3.039,3.431 2.695,3.661 2.313,3.819 1.907,3.9
  pour cut-out: 1.7,41.7 1.493,41.7 1.087,41.619 0.705,41.461 0.361,41.231 0.069,40.939 -0.161,40.595 -0.319,40.213 -0.4,39.807 -0.4,39.6 -0.4,39.393 -0.319,38.987 -0.161,38.605 0.069,38.261 0.361,37.969 0.705,37.739 1.087,37.581 1.493,37.5 1.7,37.5 1.907,37.5 2.313,37.581 2.695,37.739 3.039,37.969 3.331,38.261 3.561,38.605 3.719,38.987 3.8,39.393 3.8,39.6 3.8,39.807 3.719,40.213 3.561,40.595 3.331,40.939 3.039,41.231 2.695,41.461 2.313,41.619 1.907,41.7
  pour cut-out: 54.81,3.9 54.603,3.9 54.197,3.819 53.815,3.661 53.471,3.431 53.179,3.139 52.949,2.795 52.791,2.413 52.71,2.007 52.71,1.8 52.71,1.593 52.791,1.187 52.949,0.805 53.179,0.461 53.471,0.169 53.815,-0.061 54.197,-0.219 54.603,-0.3 54.81,-0.3 55.017,-0.3 55.423,-0.219 55.805,-0.061 56.149,0.169 56.441,0.461 56.671,0.805 56.829,1.187 56.91,1.593 56.91,1.8 56.91,2.007 56.829,2.413 56.671,2.795 56.441,3.139 56.149,3.431 55.805,3.661 55.423,3.819 55.017,3.9
  pour cut-out: 54.81,41.7 54.603,41.7 54.197,41.619 53.815,41.461 53.471,41.231 53.179,40.939 52.949,40.595 52.791,40.213 52.71,39.807 52.71,39.6 52.71,39.393 52.791,38.987 52.949,38.605 53.179,38.261 53.471,37.969 53.815,37.739 54.197,37.581 54.603,37.5 54.81,37.5 55.017,37.5 55.423,37.581 55.805,37.739 56.149,37.969 56.441,38.261 56.671,38.605 56.829,38.987 56.91,39.393 56.91,39.6 56.91,39.807 56.829,40.213 56.671,40.595 56.441,40.939 56.149,41.231 55.805,41.461 55.423,41.619 55.017,41.7
Bottom Layer:
  pour cut-out: 1.7,3.9 1.493,3.9 1.087,3.819 0.705,3.661 0.361,3.431 0.069,3.139 -0.161,2.795 -0.319,2.413 -0.4,2.007 -0.4,1.8 -0.4,1.593 -0.319,1.187 -0.161,0.805 0.069,0.461 0.361,0.169 0.705,-0.061 1.087,-0.219 1.493,-0.3 1.7,-0.3 1.907,-0.3 2.313,-0.219 2.695,-0.061 3.039,0.169 3.331,0.461 3.561,0.805 3.719,1.187 3.8,1.593 3.8,1.8 3.8,2.007 3.719,2.413 3.561,2.795 3.331,3.139 3.039,3.431 2.695,3.661 2.313,3.819 1.907,3.9
  pour cut-out: 1.7,41.7 1.493,41.7 1.087,41.619 0.705,41.461 0.361,41.231 0.069,40.939 -0.161,40.595 -0.319,40.213 -0.4,39.807 -0.4,39.6 -0.4,39.393 -0.319,38.987 -0.161,38.605 0.069,38.261 0.361,37.969 0.705,37.739 1.087,37.581 1.493,37.5 1.7,37.5 1.907,37.5 2.313,37.581 2.695,37.739 3.039,37.969 3.331,38.261 3.561,38.605 3.719,38.987 3.8,39.393 3.8,39.6 3.8,39.807 3.719,40.213 3.561,40.595 3.331,40.939 3.039,41.231 2.695,41.461 2.313,41.619 1.907,41.7
  pour cut-out: 54.81,3.9 54.603,3.9 54.197,3.819 53.815,3.661 53.471,3.431 53.179,3.139 52.949,2.795 52.791,2.413 52.71,2.007 52.71,1.8 52.71,1.593 52.791,1.187 52.949,0.805 53.179,0.461 53.471,0.169 53.815,-0.061 54.197,-0.219 54.603,-0.3 54.81,-0.3 55.017,-0.3 55.423,-0.219 55.805,-0.061 56.149,0.169 56.441,0.461 56.671,0.805 56.829,1.187 56.91,1.593 56.91,1.8 56.91,2.007 56.829,2.413 56.671,2.795 56.441,3.139 56.149,3.431 55.805,3.661 55.423,3.819 55.017,3.9
  pour cut-out: 54.81,41.7 54.603,41.7 54.197,41.619 53.815,41.461 53.471,41.231 53.179,40.939 52.949,40.595 52.791,40.213 52.71,39.807 52.71,39.6 52.71,39.393 52.791,38.987 52.949,38.605 53.179,38.261 53.471,37.969 53.815,37.739 54.197,37.581 54.603,37.5 54.81,37.5 55.017,37.5 55.423,37.581 55.805,37.739 56.149,37.969 56.441,38.261 56.671,38.605 56.829,38.987 56.91,39.393 56.91,39.6 56.91,39.807 56.829,40.213 56.671,40.595 56.441,40.939 56.149,41.231 55.805,41.461 55.423,41.619 55.017,41.7
Top Overlay:
  circle w0.2: c56.65,31.81 r0.15
  circle w0.2: c53.07,31.81 r0.15
  circle w0.2: c8.63,31.81 r0.15
  circle w0.2: c5.05,31.81 r0.15
  rectangle: 49.9,40.1 50.3,40.4
  rectangle: 49.8,40 50.4,40.3
  rectangle: 49.6,39.8 50.6,40.1
  rectangle: 49.35,39.6 50.85,39.9
  rectangle: 49.2,39.4 51,39.7
  rectangle: 49,39.2 51.2,39.5
  rectangle: 48.8,39 51.4,39.3
  lines w0.2: 0.3,5.23 8.13,5.23 8.13,33.93 0.3,33.93 0.3,5.23 ; 48.32,5.23 56.15,5.23 56.15,33.93 48.32,33.93 48.32,5.23
  lines w0.254: 48.6,39 50.1,40.5 51.6,39 48.6,39
  lines w0.3: 1.71,41.782 54.905,41.79 cw(c54.905,39.587) 57.107,39.587 57.107,1.793 cw(c54.905,1.793) 54.905,-0.41 ; 1.71,41.79 ccw(c1.71,39.587) -0.493,39.587 -0.493,1.783 ccw(c1.71,1.783) 1.71,-0.42 54.905,-0.4
  text "100" at 48.39,4.57 h1
  text "2" at 48.34,34.1 h1
  text "99" at 55.24,4.57 h1
  text "1" at 55.82,34.1 h1
  text "1" at 7.8,34.1 h1
  text "99" at 7.22,4.57 h1
  text "2" at 0.32,34.1 h1
  text "100" at 0.37,4.57 h1
3D body "AXK500147YG.stp": height -0.4, standoff -2.75, extent 49.3,5.47 55.1,33.67
3D body "AXK500147YG.stp": height -0.4, standoff -2.75, extent 1.3,5.47 7.1,33.67
3D body "PW20.step": height 7.62, standoff 1.04, extent -0.4,-0.4 57.2,41.782